# Altium footprint library smd-ipc.PCBLIB: 363 footprints (part 21 of 27) (continued)
## SQFP-S-14X14-168 [mm]
pads (168):
  rect 0.17x1.6 smd: 1(-6.15,-7.6) 2(-5.85,-7.6) 3(-5.55,-7.6) 4(-5.25,-7.6) 5(-4.95,-7.6) 6(-4.65,-7.6) 7(-4.35,-7.6) 8(-4.05,-7.6) 9(-3.75,-7.6) 10(-3.45,-7.6) 11(-3.15,-7.6) 12(-2.85,-7.6) 13(-2.55,-7.6) 14(-2.25,-7.6) 15(-1.95,-7.6) 16(-1.65,-7.6) 17(-1.35,-7.6) 18(-1.05,-7.6) 19(-0.75,-7.6) 20(-0.45,-7.6) 21(-0.15,-7.6) 22(0.15,-7.6) 23(0.45,-7.6) 24(0.75,-7.6) 25(1.05,-7.6) 26(1.35,-7.6) 27(1.65,-7.6) 28(1.95,-7.6) 29(2.25,-7.6) 30(2.55,-7.6) 31(2.85,-7.6) 32(3.15,-7.6) 33(3.45,-7.6) 34(3.75,-7.6) 35(4.05,-7.6) 36(4.35,-7.6) 37(4.65,-7.6) 38(4.95,-7.6) 39(5.25,-7.6) 40(5.55,-7.6) 41(5.85,-7.6) 42(6.15,-7.6) 85(6.15,7.6) 86(5.85,7.6) 87(5.55,7.6) 88(5.25,7.6) 89(4.95,7.6) 90(4.65,7.6) 91(4.35,7.6) 92(4.05,7.6) 93(3.75,7.6) 94(3.45,7.6) 95(3.15,7.6) 96(2.85,7.6) 97(2.55,7.6) 98(2.25,7.6) 99(1.95,7.6) 100(1.65,7.6) 101(1.35,7.6) 102(1.05,7.6) 103(0.75,7.6) 104(0.45,7.6) 105(0.15,7.6) 106(-0.15,7.6) 107(-0.45,7.6) 108(-0.75,7.6) 109(-1.05,7.6) 110(-1.35,7.6) 111(-1.65,7.6) 112(-1.95,7.6) 113(-2.25,7.6) 114(-2.55,7.6) 115(-2.85,7.6) 116(-3.15,7.6) 117(-3.45,7.6) 118(-3.75,7.6) 119(-4.05,7.6) 120(-4.35,7.6) 121(-4.65,7.6) 122(-4.95,7.6) 123(-5.25,7.6) 124(-5.55,7.6) 125(-5.85,7.6) 126(-6.15,7.6)
  rect 1.6x0.17 smd: 43(7.6,-6.15) 44(7.6,-5.85) 45(7.6,-5.55) 46(7.6,-5.25) 47(7.6,-4.95) 48(7.6,-4.65) 49(7.6,-4.35) 50(7.6,-4.05) 51(7.6,-3.75) 52(7.6,-3.45) 53(7.6,-3.15) 54(7.6,-2.85) 55(7.6,-2.55) 56(7.6,-2.25) 57(7.6,-1.95) 58(7.6,-1.65) 59(7.6,-1.35) 60(7.6,-1.05) 61(7.6,-0.75) 62(7.6,-0.45) 63(7.6,-0.15) 64(7.6,0.15) 65(7.6,0.45) 66(7.6,0.75) 67(7.6,1.05) 68(7.6,1.35) 69(7.6,1.65) 70(7.6,1.95) 71(7.6,2.25) 72(7.6,2.55) 73(7.6,2.85) 74(7.6,3.15) 75(7.6,3.45) 76(7.6,3.75) 77(7.6,4.05) 78(7.6,4.35) 79(7.6,4.65) 80(7.6,4.95) 81(7.6,5.25) 82(7.6,5.55) 83(7.6,5.85) 84(7.6,6.15) 127(-7.6,6.15) 128(-7.6,5.85) 129(-7.6,5.55) 130(-7.6,5.25) 131(-7.6,4.95) 132(-7.6,4.65) 133(-7.6,4.35) 134(-7.6,4.05) 135(-7.6,3.75) 136(-7.6,3.45) 137(-7.6,3.15) 138(-7.6,2.85) 139(-7.6,2.55) 140(-7.6,2.25) 141(-7.6,1.95) 142(-7.6,1.65) 143(-7.6,1.35) 144(-7.6,1.05) 145(-7.6,0.75) 146(-7.6,0.45) 147(-7.6,0.15) 148(-7.6,-0.15) 149(-7.6,-0.45) 150(-7.6,-0.75) 151(-7.6,-1.05) 152(-7.6,-1.35) 153(-7.6,-1.65) 154(-7.6,-1.95) 155(-7.6,-2.25) 156(-7.6,-2.55) 157(-7.6,-2.85) 158(-7.6,-3.15) 159(-7.6,-3.45) 160(-7.6,-3.75) 161(-7.6,-4.05) 162(-7.6,-4.35) 163(-7.6,-4.65) 164(-7.6,-4.95) 165(-7.6,-5.25) 166(-7.6,-5.55) 167(-7.6,-5.85) 168(-7.6,-6.15)
Top Overlay:
  circle w0.254: c-5.5,-5.5 r0.75
  lines w0.203: -6.72,-6.71 6.71,-6.71 6.71,6.71 -6.72,6.71 -6.72,-6.71
Mechanical 16:
  drawing of 172 lines, arcs and shapes, not listed
Mechanical 27:
  lines w0.2: -8.9,-8.9 -8.9,8.9 8.9,8.9 8.9,-8.9 -8.9,-8.9

## SQFP-S-14X14-176 [mm]
pads (176):
  rect 0.17x1.6 smd: 1(-6.45,-7.6) 2(-6.15,-7.6) 3(-5.85,-7.6) 4(-5.55,-7.6) 5(-5.25,-7.6) 6(-4.95,-7.6) 7(-4.65,-7.6) 8(-4.35,-7.6) 9(-4.05,-7.6) 10(-3.75,-7.6) 11(-3.45,-7.6) 12(-3.15,-7.6) 13(-2.85,-7.6) 14(-2.55,-7.6) 15(-2.25,-7.6) 16(-1.95,-7.6) 17(-1.65,-7.6) 18(-1.35,-7.6) 19(-1.05,-7.6) 20(-0.75,-7.6) 21(-0.45,-7.6) 22(-0.15,-7.6) 23(0.15,-7.6) 24(0.45,-7.6) 25(0.75,-7.6) 26(1.05,-7.6) 27(1.35,-7.6) 28(1.65,-7.6) 29(1.95,-7.6) 30(2.25,-7.6) 31(2.55,-7.6) 32(2.85,-7.6) 33(3.15,-7.6) 34(3.45,-7.6) 35(3.75,-7.6) 36(4.05,-7.6) 37(4.35,-7.6) 38(4.65,-7.6) 39(4.95,-7.6) 40(5.25,-7.6) 41(5.55,-7.6) 42(5.85,-7.6) 43(6.15,-7.6) 44(6.45,-7.6) 89(6.45,7.6) 90(6.15,7.6) 91(5.85,7.6) 92(5.55,7.6) 93(5.25,7.6) 94(4.95,7.6) 95(4.65,7.6) 96(4.35,7.6) 97(4.05,7.6) 98(3.75,7.6) 99(3.45,7.6) 100(3.15,7.6) 101(2.85,7.6) 102(2.55,7.6) 103(2.25,7.6) 104(1.95,7.6) 105(1.65,7.6) 106(1.35,7.6) 107(1.05,7.6) 108(0.75,7.6) 109(0.45,7.6) 110(0.15,7.6) 111(-0.15,7.6) 112(-0.45,7.6) 113(-0.75,7.6) 114(-1.05,7.6) 115(-1.35,7.6) 116(-1.65,7.6) 117(-1.95,7.6) 118(-2.25,7.6) 119(-2.55,7.6) 120(-2.85,7.6) 121(-3.15,7.6) 122(-3.45,7.6) 123(-3.75,7.6) 124(-4.05,7.6) 125(-4.35,7.6) 126(-4.65,7.6) 127(-4.95,7.6) 128(-5.25,7.6) 129(-5.55,7.6) 130(-5.85,7.6) 131(-6.15,7.6) 132(-6.45,7.6)
  rect 1.6x0.17 smd: 45(7.6,-6.45) 46(7.6,-6.15) 47(7.6,-5.85) 48(7.6,-5.55) 49(7.6,-5.25) 50(7.6,-4.95) 51(7.6,-4.65) 52(7.6,-4.35) 53(7.6,-4.05) 54(7.6,-3.75) 55(7.6,-3.45) 56(7.6,-3.15) 57(7.6,-2.85) 58(7.6,-2.55) 59(7.6,-2.25) 60(7.6,-1.95) 61(7.6,-1.65) 62(7.6,-1.35) 63(7.6,-1.05) 64(7.6,-0.75) 65(7.6,-0.45) 66(7.6,-0.15) 67(7.6,0.15) 68(7.6,0.45) 69(7.6,0.75) 70(7.6,1.05) 71(7.6,1.35) 72(7.6,1.65) 73(7.6,1.95) 74(7.6,2.25) 75(7.6,2.55) 76(7.6,2.85) 77(7.6,3.15) 78(7.6,3.45) 79(7.6,3.75) 80(7.6,4.05) 81(7.6,4.35) 82(7.6,4.65) 83(7.6,4.95) 84(7.6,5.25) 85(7.6,5.55) 86(7.6,5.85) 87(7.6,6.15) 88(7.6,6.45) 133(-7.6,6.45) 134(-7.6,6.15) 135(-7.6,5.85) 136(-7.6,5.55) 137(-7.6,5.25) 138(-7.6,4.95) 139(-7.6,4.65) 140(-7.6,4.35) 141(-7.6,4.05) 142(-7.6,3.75) 143(-7.6,3.45) 144(-7.6,3.15) 145(-7.6,2.85) 146(-7.6,2.55) 147(-7.6,2.25) 148(-7.6,1.95) 149(-7.6,1.65) 150(-7.6,1.35) 151(-7.6,1.05) 152(-7.6,0.75) 153(-7.6,0.45) 154(-7.6,0.15) 155(-7.6,-0.15) 156(-7.6,-0.45) 157(-7.6,-0.75) 158(-7.6,-1.05) 159(-7.6,-1.35) 160(-7.6,-1.65) 161(-7.6,-1.95) 162(-7.6,-2.25) 163(-7.6,-2.55) 164(-7.6,-2.85) 165(-7.6,-3.15) 166(-7.6,-3.45) 167(-7.6,-3.75) 168(-7.6,-4.05) 169(-7.6,-4.35) 170(-7.6,-4.65) 171(-7.6,-4.95) 172(-7.6,-5.25) 173(-7.6,-5.55) 174(-7.6,-5.85) 175(-7.6,-6.15) 176(-7.6,-6.45)
Top Overlay:
  circle w0.254: c-5.5,-5.5 r0.75
  lines w0.203: -6.72,-6.71 6.71,-6.71 6.71,6.71 -6.72,6.71 -6.72,-6.71
Mechanical 16:
  drawing of 180 lines, arcs and shapes, not listed
Mechanical 27:
  lines w0.2: -8.9,-8.9 -8.9,8.9 8.9,8.9 8.9,-8.9 -8.9,-8.9

## SQFP-S-20X20-144 [mm]
pads (144):
  rect 0.3x1.6 smd: 1(-8.75,-10.6) 2(-8.25,-10.6) 3(-7.75,-10.6) 4(-7.25,-10.6) 5(-6.75,-10.6) 6(-6.25,-10.6) 7(-5.75,-10.6) 8(-5.25,-10.6) 9(-4.75,-10.6) 10(-4.25,-10.6) 11(-3.75,-10.6) 12(-3.25,-10.6) 13(-2.75,-10.6) 14(-2.25,-10.6) 15(-1.75,-10.6) 16(-1.25,-10.6) 17(-0.75,-10.6) 18(-0.25,-10.6) 19(0.25,-10.6) 20(0.75,-10.6) 21(1.25,-10.6) 22(1.75,-10.6) 23(2.25,-10.6) 24(2.75,-10.6) 25(3.25,-10.6) 26(3.75,-10.6) 27(4.25,-10.6) 28(4.75,-10.6) 29(5.25,-10.6) 30(5.75,-10.6) 31(6.25,-10.6) 32(6.75,-10.6) 33(7.25,-10.6) 34(7.75,-10.6) 35(8.25,-10.6) 36(8.75,-10.6) 73(8.75,10.6) 74(8.25,10.6) 75(7.75,10.6) 76(7.25,10.6) 77(6.75,10.6) 78(6.25,10.6) 79(5.75,10.6) 80(5.25,10.6) 81(4.75,10.6) 82(4.25,10.6) 83(3.75,10.6) 84(3.25,10.6) 85(2.75,10.6) 86(2.25,10.6) 87(1.75,10.6) 88(1.25,10.6) 89(0.75,10.6) 90(0.25,10.6) 91(-0.25,10.6) 92(-0.75,10.6) 93(-1.25,10.6) 94(-1.75,10.6) 95(-2.25,10.6) 96(-2.75,10.6) 97(-3.25,10.6) 98(-3.75,10.6) 99(-4.25,10.6) 100(-4.75,10.6) 101(-5.25,10.6) 102(-5.75,10.6) 103(-6.25,10.6) 104(-6.75,10.6) 105(-7.25,10.6) 106(-7.75,10.6) 107(-8.25,10.6) 108(-8.75,10.6)
  rect 1.6x0.3 smd: 37(10.6,-8.75) 38(10.6,-8.25) 39(10.6,-7.75) 40(10.6,-7.25) 41(10.6,-6.75) 42(10.6,-6.25) 43(10.6,-5.75) 44(10.6,-5.25) 45(10.6,-4.75) 46(10.6,-4.25) 47(10.6,-3.75) 48(10.6,-3.25) 49(10.6,-2.75) 50(10.6,-2.25) 51(10.6,-1.75) 52(10.6,-1.25) 53(10.6,-0.75) 54(10.6,-0.25) 55(10.6,0.25) 56(10.6,0.75) 57(10.6,1.25) 58(10.6,1.75) 59(10.6,2.25) 60(10.6,2.75) 61(10.6,3.25) 62(10.6,3.75) 63(10.6,4.25) 64(10.6,4.75) 65(10.6,5.25) 66(10.6,5.75) 67(10.6,6.25) 68(10.6,6.75) 69(10.6,7.25) 70(10.6,7.75) 71(10.6,8.25) 72(10.6,8.75) 109(-10.6,8.75) 110(-10.6,8.25) 111(-10.6,7.75) 112(-10.6,7.25) 113(-10.6,6.75) 114(-10.6,6.25) 115(-10.6,5.75) 116(-10.6,5.25) 117(-10.6,4.75) 118(-10.6,4.25) 119(-10.6,3.75) 120(-10.6,3.25) 121(-10.6,2.75) 122(-10.6,2.25) 123(-10.6,1.75) 124(-10.6,1.25) 125(-10.6,0.75) 126(-10.6,0.25) 127(-10.6,-0.25) 128(-10.6,-0.75) 129(-10.6,-1.25) 130(-10.6,-1.75) 131(-10.6,-2.25) 132(-10.6,-2.75) 133(-10.6,-3.25) 134(-10.6,-3.75) 135(-10.6,-4.25) 136(-10.6,-4.75) 137(-10.6,-5.25) 138(-10.6,-5.75) 139(-10.6,-6.25) 140(-10.6,-6.75) 141(-10.6,-7.25) 142(-10.6,-7.75) 143(-10.6,-8.25) 144(-10.6,-8.75)
Top Overlay:
  circle w0.254: c-8.5,-8.5 r0.75
  lines w0.203: -9.72,-9.71 9.71,-9.71 9.71,9.71 -9.72,9.71 -9.72,-9.71
Mechanical 16:
  rectangle: -8.9,-10.9 -8.6,-9.95
  rectangle: -8.4,-10.9 -8.1,-9.95
  rectangle: -7.9,-10.9 -7.6,-9.95
  rectangle: -7.4,-10.9 -7.1,-9.95
  rectangle: -6.9,-10.9 -6.6,-9.95
  rectangle: -6.4,-10.9 -6.1,-9.95
  rectangle: -5.9,-10.9 -5.6,-9.95
  rectangle: -5.4,-10.9 -5.1,-9.95
  rectangle: -4.9,-10.9 -4.6,-9.95
  rectangle: -4.4,-10.9 -4.1,-9.95
  rectangle: -3.9,-10.9 -3.6,-9.95
  rectangle: -3.4,-10.9 -3.1,-9.95
  rectangle: -2.9,-10.9 -2.6,-9.95
  rectangle: -2.4,-10.9 -2.1,-9.95
  rectangle: -1.9,-10.9 -1.6,-9.95
  rectangle: -1.4,-10.9 -1.1,-9.95
  rectangle: -0.9,-10.9 -0.6,-9.95
  rectangle: -0.4,-10.9 -0.1,-9.95
  rectangle: 0.1,-10.9 0.4,-9.95
  rectangle: 0.6,-10.9 0.9,-9.95
  rectangle: 1.1,-10.9 1.4,-9.95
  rectangle: 1.6,-10.9 1.9,-9.95
  rectangle: 2.1,-10.9 2.4,-9.95
  rectangle: 2.6,-10.9 2.9,-9.95
  rectangle: 3.1,-10.9 3.4,-9.95
  rectangle: 3.6,-10.9 3.9,-9.95
  rectangle: 4.1,-10.9 4.4,-9.95
  rectangle: 4.6,-10.9 4.9,-9.95
  rectangle: 5.1,-10.9 5.4,-9.95
  rectangle: 5.6,-10.9 5.9,-9.95
  rectangle: 6.1,-10.9 6.4,-9.95
  rectangle: 6.6,-10.9 6.9,-9.95
  rectangle: 7.1,-10.9 7.4,-9.95
  rectangle: 7.6,-10.9 7.9,-9.95
  rectangle: 8.1,-10.9 8.4,-9.95
  rectangle: 8.6,-10.9 8.9,-9.95
  rectangle: 9.95,-8.9 10.9,-8.6
  rectangle: 9.95,-8.4 10.9,-8.1
  rectangle: 9.95,-7.9 10.9,-7.6
  rectangle: 9.95,-7.4 10.9,-7.1
  rectangle: 9.95,-6.9 10.9,-6.6
  rectangle: 9.95,-6.4 10.9,-6.1
  rectangle: 9.95,-5.9 10.9,-5.6
  rectangle: 9.95,-5.4 10.9,-5.1
  rectangle: 9.95,-4.9 10.9,-4.6
  rectangle: 9.95,-4.4 10.9,-4.1
  rectangle: 9.95,-3.9 10.9,-3.6
  rectangle: 9.95,-3.4 10.9,-3.1
  rectangle: 9.95,-2.9 10.9,-2.6
  rectangle: 9.95,-2.4 10.9,-2.1
  rectangle: 9.95,-1.9 10.9,-1.6
  rectangle: 9.95,-1.4 10.9,-1.1
  rectangle: 9.95,-0.9 10.9,-0.6
  rectangle: 9.95,-0.4 10.9,-0.1
  rectangle: 9.95,0.1 10.9,0.4
  rectangle: 9.95,0.6 10.9,0.9
  rectangle: 9.95,1.1 10.9,1.4
  rectangle: 9.95,1.6 10.9,1.9
  rectangle: 9.95,2.1 10.9,2.4
  rectangle: 9.95,2.6 10.9,2.9
  rectangle: 9.95,3.1 10.9,3.4
  rectangle: 9.95,3.6 10.9,3.9
  rectangle: 9.95,4.1 10.9,4.4
  rectangle: 9.95,4.6 10.9,4.9
  rectangle: 9.95,5.1 10.9,5.4
  rectangle: 9.95,5.6 10.9,5.9
  rectangle: 9.95,6.1 10.9,6.4
  rectangle: 9.95,6.6 10.9,6.9
  rectangle: 9.95,7.1 10.9,7.4
  rectangle: 9.95,7.6 10.9,7.9
  rectangle: 9.95,8.1 10.9,8.4
  rectangle: 9.95,8.6 10.9,8.9
  rectangle: 8.6,9.95 8.9,10.9
  rectangle: 8.1,9.95 8.4,10.9
  rectangle: 7.6,9.95 7.9,10.9
  rectangle: 7.1,9.95 7.4,10.9
  rectangle: 6.6,9.95 6.9,10.9
  rectangle: 6.1,9.95 6.4,10.9
  rectangle: 5.6,9.95 5.9,10.9
  rectangle: 5.1,9.95 5.4,10.9
  rectangle: 4.6,9.95 4.9,10.9
  rectangle: 4.1,9.95 4.4,10.9
  rectangle: 3.6,9.95 3.9,10.9
  rectangle: 3.1,9.95 3.4,10.9
  rectangle: 2.6,9.95 2.9,10.9
  rectangle: 2.1,9.95 2.4,10.9
  rectangle: 1.6,9.95 1.9,10.9
  rectangle: 1.1,9.95 1.4,10.9
  rectangle: 0.6,9.95 0.9,10.9
  rectangle: 0.1,9.95 0.4,10.9
  rectangle: -0.4,9.95 -0.1,10.9
  rectangle: -0.9,9.95 -0.6,10.9
  rectangle: -1.4,9.95 -1.1,10.9
  rectangle: -1.9,9.95 -1.6,10.9
  rectangle: -2.4,9.95 -2.1,10.9
  rectangle: -2.9,9.95 -2.6,10.9
  rectangle: -3.4,9.95 -3.1,10.9
  rectangle: -3.9,9.95 -3.6,10.9
  rectangle: -4.4,9.95 -4.1,10.9
  rectangle: -4.9,9.95 -4.6,10.9
  rectangle: -5.4,9.95 -5.1,10.9
  rectangle: -5.9,9.95 -5.6,10.9
  rectangle: -6.4,9.95 -6.1,10.9
  rectangle: -6.9,9.95 -6.6,10.9
  rectangle: -7.4,9.95 -7.1,10.9
  rectangle: -7.9,9.95 -7.6,10.9
  rectangle: -8.4,9.95 -8.1,10.9
  rectangle: -8.9,9.95 -8.6,10.9
  rectangle: -10.9,8.6 -9.95,8.9
  rectangle: -10.9,8.1 -9.95,8.4
  rectangle: -10.9,7.6 -9.95,7.9
  rectangle: -10.9,7.1 -9.95,7.4
  rectangle: -10.9,6.6 -9.95,6.9
  rectangle: -10.9,6.1 -9.95,6.4
  rectangle: -10.9,5.6 -9.95,5.9
  rectangle: -10.9,5.1 -9.95,5.4
  rectangle: -10.9,4.6 -9.95,4.9
  rectangle: -10.9,4.1 -9.95,4.4
  rectangle: -10.9,3.6 -9.95,3.9
  rectangle: -10.9,3.1 -9.95,3.4
  rectangle: -10.9,2.6 -9.95,2.9
  rectangle: -10.9,2.1 -9.95,2.4
  rectangle: -10.9,1.6 -9.95,1.9
  rectangle: -10.9,1.1 -9.95,1.4
  rectangle: -10.9,0.6 -9.95,0.9
  rectangle: -10.9,0.1 -9.95,0.4
  rectangle: -10.9,-0.4 -9.95,-0.1
  rectangle: -10.9,-0.9 -9.95,-0.6
  rectangle: -10.9,-1.4 -9.95,-1.1
  rectangle: -10.9,-1.9 -9.95,-1.6
  rectangle: -10.9,-2.4 -9.95,-2.1
  rectangle: -10.9,-2.9 -9.95,-2.6
  rectangle: -10.9,-3.4 -9.95,-3.1
  rectangle: -10.9,-3.9 -9.95,-3.6
  rectangle: -10.9,-4.4 -9.95,-4.1
  rectangle: -10.9,-4.9 -9.95,-4.6
  rectangle: -10.9,-5.4 -9.95,-5.1
  rectangle: -10.9,-5.9 -9.95,-5.6
  rectangle: -10.9,-6.4 -9.95,-6.1
  rectangle: -10.9,-6.9 -9.95,-6.6
  rectangle: -10.9,-7.4 -9.95,-7.1
  rectangle: -10.9,-7.9 -9.95,-7.6
  rectangle: -10.9,-8.4 -9.95,-8.1
  rectangle: -10.9,-8.9 -9.95,-8.6
  lines w0.203: -9.91,-9.91 9.91,-9.91 9.91,9.91 -9.91,9.91 -9.91,-9.91
Mechanical 27:
  lines w0.2: -11.9,-11.9 -11.9,11.9 11.9,11.9 11.9,-11.9 -11.9,-11.9

## SQFP-S-20X20-152 [mm]
pads (152):
  rect 0.3x1.6 smd: 1(-9.25,-10.6) 2(-8.75,-10.6) 3(-8.25,-10.6) 4(-7.75,-10.6) 5(-7.25,-10.6) 6(-6.75,-10.6) 7(-6.25,-10.6) 8(-5.75,-10.6) 9(-5.25,-10.6) 10(-4.75,-10.6) 11(-4.25,-10.6) 12(-3.75,-10.6) 13(-3.25,-10.6) 14(-2.75,-10.6) 15(-2.25,-10.6) 16(-1.75,-10.6) 17(-1.25,-10.6) 18(-0.75,-10.6) 19(-0.25,-10.6) 20(0.25,-10.6) 21(0.75,-10.6) 22(1.25,-10.6) 23(1.75,-10.6) 24(2.25,-10.6) 25(2.75,-10.6) 26(3.25,-10.6) 27(3.75,-10.6) 28(4.25,-10.6) 29(4.75,-10.6) 30(5.25,-10.6) 31(5.75,-10.6) 32(6.25,-10.6) 33(6.75,-10.6) 34(7.25,-10.6) 35(7.75,-10.6) 36(8.25,-10.6) 37(8.75,-10.6) 38(9.25,-10.6) 77(9.25,10.6) 78(8.75,10.6) 79(8.25,10.6) 80(7.75,10.6) 81(7.25,10.6) 82(6.75,10.6) 83(6.25,10.6) 84(5.75,10.6) 85(5.25,10.6) 86(4.75,10.6) 87(4.25,10.6) 88(3.75,10.6) 89(3.25,10.6) 90(2.75,10.6) 91(2.25,10.6) 92(1.75,10.6) 93(1.25,10.6) 94(0.75,10.6) 95(0.25,10.6) 96(-0.25,10.6) 97(-0.75,10.6) 98(-1.25,10.6) 99(-1.75,10.6) 100(-2.25,10.6) 101(-2.75,10.6) 102(-3.25,10.6) 103(-3.75,10.6) 104(-4.25,10.6) 105(-4.75,10.6) 106(-5.25,10.6) 107(-5.75,10.6) 108(-6.25,10.6) 109(-6.75,10.6) 110(-7.25,10.6) 111(-7.75,10.6) 112(-8.25,10.6) 113(-8.75,10.6) 114(-9.25,10.6)
  rect 1.6x0.3 smd: 39(10.6,-9.25) 40(10.6,-8.75) 41(10.6,-8.25) 42(10.6,-7.75) 43(10.6,-7.25) 44(10.6,-6.75) 45(10.6,-6.25) 46(10.6,-5.75) 47(10.6,-5.25) 48(10.6,-4.75) 49(10.6,-4.25) 50(10.6,-3.75) 51(10.6,-3.25) 52(10.6,-2.75) 53(10.6,-2.25) 54(10.6,-1.75) 55(10.6,-1.25) 56(10.6,-0.75) 57(10.6,-0.25) 58(10.6,0.25) 59(10.6,0.75) 60(10.6,1.25) 61(10.6,1.75) 62(10.6,2.25) 63(10.6,2.75) 64(10.6,3.25) 65(10.6,3.75) 66(10.6,4.25) 67(10.6,4.75) 68(10.6,5.25) 69(10.6,5.75) 70(10.6,6.25) 71(10.6,6.75) 72(10.6,7.25) 73(10.6,7.75) 74(10.6,8.25) 75(10.6,8.75) 76(10.6,9.25) 115(-10.6,9.25) 116(-10.6,8.75) 117(-10.6,8.25) 118(-10.6,7.75) 119(-10.6,7.25) 120(-10.6,6.75) 121(-10.6,6.25) 122(-10.6,5.75) 123(-10.6,5.25) 124(-10.6,4.75) 125(-10.6,4.25) 126(-10.6,3.75) 127(-10.6,3.25) 128(-10.6,2.75) 129(-10.6,2.25) 130(-10.6,1.75) 131(-10.6,1.25) 132(-10.6,0.75) 133(-10.6,0.25) 134(-10.6,-0.25) 135(-10.6,-0.75) 136(-10.6,-1.25) 137(-10.6,-1.75) 138(-10.6,-2.25) 139(-10.6,-2.75) 140(-10.6,-3.25) 141(-10.6,-3.75) 142(-10.6,-4.25) 143(-10.6,-4.75) 144(-10.6,-5.25) 145(-10.6,-5.75) 146(-10.6,-6.25) 147(-10.6,-6.75) 148(-10.6,-7.25) 149(-10.6,-7.75) 150(-10.6,-8.25) 151(-10.6,-8.75) 152(-10.6,-9.25)
Top Overlay:
  circle w0.254: c-8.5,-8.5 r0.75
  lines w0.203: -9.72,-9.71 9.71,-9.71 9.71,9.71 -9.72,9.71 -9.72,-9.71
Mechanical 16:
  drawing of 156 lines, arcs and shapes, not listed
Mechanical 27:
  lines w0.2: -11.9,-11.9 -11.9,11.9 11.9,11.9 11.9,-11.9 -11.9,-11.9

## SQFP-S-20X20-184 [mm]
pads (184):
  rect 0.25x1.6 smd: 1(-9,-10.6) 2(-8.6,-10.6) 3(-8.2,-10.6) 4(-7.8,-10.6) 5(-7.4,-10.6) 6(-7,-10.6) 7(-6.6,-10.6) 8(-6.2,-10.6) 9(-5.8,-10.6) 10(-5.4,-10.6) 11(-5,-10.6) 12(-4.6,-10.6) 13(-4.2,-10.6) 14(-3.8,-10.6) 15(-3.4,-10.6) 16(-3,-10.6) 17(-2.6,-10.6) 18(-2.2,-10.6) 19(-1.8,-10.6) 20(-1.4,-10.6) 21(-1,-10.6) 22(-0.6,-10.6) 23(-0.2,-10.6) 24(0.2,-10.6) 25(0.6,-10.6) 26(1,-10.6) 27(1.4,-10.6) 28(1.8,-10.6) 29(2.2,-10.6) 30(2.6,-10.6) 31(3,-10.6) 32(3.4,-10.6) 33(3.8,-10.6) 34(4.2,-10.6) 35(4.6,-10.6) 36(5,-10.6) 37(5.4,-10.6) 38(5.8,-10.6) 39(6.2,-10.6) 40(6.6,-10.6) 41(7,-10.6) 42(7.4,-10.6) 43(7.8,-10.6) 44(8.2,-10.6) 45(8.6,-10.6) 46(9,-10.6) 93(9,10.6) 94(8.6,10.6) 95(8.2,10.6) 96(7.8,10.6) 97(7.4,10.6) 98(7,10.6) 99(6.6,10.6) 100(6.2,10.6) 101(5.8,10.6) 102(5.4,10.6) 103(5,10.6) 104(4.6,10.6) 105(4.2,10.6) 106(3.8,10.6) 107(3.4,10.6) 108(3,10.6) 109(2.6,10.6) 110(2.2,10.6) 111(1.8,10.6) 112(1.4,10.6) 113(1,10.6) 114(0.6,10.6) 115(0.2,10.6) 116(-0.2,10.6) 117(-0.6,10.6) 118(-1,10.6) 119(-1.4,10.6) 120(-1.8,10.6) 121(-2.2,10.6) 122(-2.6,10.6) 123(-3,10.6) 124(-3.4,10.6) 125(-3.8,10.6) 126(-4.2,10.6) 127(-4.6,10.6) 128(-5,10.6) 129(-5.4,10.6) 130(-5.8,10.6) 131(-6.2,10.6) 132(-6.6,10.6) 133(-7,10.6) 134(-7.4,10.6) 135(-7.8,10.6) 136(-8.2,10.6) 137(-8.6,10.6) 138(-9,10.6)
  rect 1.6x0.25 smd: 47(10.6,-9) 48(10.6,-8.6) 49(10.6,-8.2) 50(10.6,-7.8) 51(10.6,-7.4) 52(10.6,-7) 53(10.6,-6.6) 54(10.6,-6.2) 55(10.6,-5.8) 56(10.6,-5.4) 57(10.6,-5) 58(10.6,-4.6) 59(10.6,-4.2) 60(10.6,-3.8) 61(10.6,-3.4) 62(10.6,-3) 63(10.6,-2.6) 64(10.6,-2.2) 65(10.6,-1.8) 66(10.6,-1.4) 67(10.6,-1) 68(10.6,-0.6) 69(10.6,-0.2) 70(10.6,0.2) 71(10.6,0.6) 72(10.6,1) 73(10.6,1.4) 74(10.6,1.8) 75(10.6,2.2) 76(10.6,2.6) 77(10.6,3) 78(10.6,3.4) 79(10.6,3.8) 80(10.6,4.2) 81(10.6,4.6) 82(10.6,5) 83(10.6,5.4) 84(10.6,5.8) 85(10.6,6.2) 86(10.6,6.6) 87(10.6,7) 88(10.6,7.4) 89(10.6,7.8) 90(10.6,8.2) 91(10.6,8.6) 92(10.6,9) 139(-10.6,9) 140(-10.6,8.6) 141(-10.6,8.2) 142(-10.6,7.8) 143(-10.6,7.4) 144(-10.6,7) 145(-10.6,6.6) 146(-10.6,6.2) 147(-10.6,5.8) 148(-10.6,5.4) 149(-10.6,5) 150(-10.6,4.6) 151(-10.6,4.2) 152(-10.6,3.8) 153(-10.6,3.4) 154(-10.6,3) 155(-10.6,2.6) 156(-10.6,2.2) 157(-10.6,1.8) 158(-10.6,1.4) 159(-10.6,1) 160(-10.6,0.6) 161(-10.6,0.2) 162(-10.6,-0.2) 163(-10.6,-0.6) 164(-10.6,-1) 165(-10.6,-1.4) 166(-10.6,-1.8) 167(-10.6,-2.2) 168(-10.6,-2.6) 169(-10.6,-3) 170(-10.6,-3.4) 171(-10.6,-3.8) 172(-10.6,-4.2) 173(-10.6,-4.6) 174(-10.6,-5) 175(-10.6,-5.4) 176(-10.6,-5.8) 177(-10.6,-6.2) 178(-10.6,-6.6) 179(-10.6,-7) 180(-10.6,-7.4) 181(-10.6,-7.8) 182(-10.6,-8.2) 183(-10.6,-8.6) 184(-10.6,-9)
Top Overlay:
  circle w0.254: c-8.5,-8.5 r0.75
  lines w0.203: -9.72,-9.71 9.71,-9.71 9.71,9.71 -9.72,9.71 -9.72,-9.71
Mechanical 16:
  drawing of 188 lines, arcs and shapes, not listed
Mechanical 27:
  lines w0.2: -11.9,-11.9 -11.9,11.9 11.9,11.9 11.9,-11.9 -11.9,-11.9

## SQFP-S-20X20-192 [mm]
pads (192):
  rect 0.25x1.6 smd: 1(-9.4,-10.6) 2(-9,-10.6) 3(-8.6,-10.6) 4(-8.2,-10.6) 5(-7.8,-10.6) 6(-7.4,-10.6) 7(-7,-10.6) 8(-6.6,-10.6) 9(-6.2,-10.6) 10(-5.8,-10.6) 11(-5.4,-10.6) 12(-5,-10.6) 13(-4.6,-10.6) 14(-4.2,-10.6) 15(-3.8,-10.6) 16(-3.4,-10.6) 17(-3,-10.6) 18(-2.6,-10.6) 19(-2.2,-10.6) 20(-1.8,-10.6) 21(-1.4,-10.6) 22(-1,-10.6) 23(-0.6,-10.6) 24(-0.2,-10.6) 25(0.2,-10.6) 26(0.6,-10.6) 27(1,-10.6) 28(1.4,-10.6) 29(1.8,-10.6) 30(2.2,-10.6) 31(2.6,-10.6) 32(3,-10.6) 33(3.4,-10.6) 34(3.8,-10.6) 35(4.2,-10.6) 36(4.6,-10.6) 37(5,-10.6) 38(5.4,-10.6) 39(5.8,-10.6) 40(6.2,-10.6) 41(6.6,-10.6) 42(7,-10.6) 43(7.4,-10.6) 44(7.8,-10.6) 45(8.2,-10.6) 46(8.6,-10.6) 47(9,-10.6) 48(9.4,-10.6) 97(9.4,10.6) 98(9,10.6) 99(8.6,10.6) 100(8.2,10.6) 101(7.8,10.6) 102(7.4,10.6) 103(7,10.6) 104(6.6,10.6) 105(6.2,10.6) 106(5.8,10.6) 107(5.4,10.6) 108(5,10.6) 109(4.6,10.6) 110(4.2,10.6) 111(3.8,10.6) 112(3.4,10.6) 113(3,10.6) 114(2.6,10.6) 115(2.2,10.6) 116(1.8,10.6) 117(1.4,10.6) 118(1,10.6) 119(0.6,10.6) 120(0.2,10.6) 121(-0.2,10.6) 122(-0.6,10.6) 123(-1,10.6) 124(-1.4,10.6) 125(-1.8,10.6) 126(-2.2,10.6) 127(-2.6,10.6) 128(-3,10.6) 129(-3.4,10.6) 130(-3.8,10.6) 131(-4.2,10.6) 132(-4.6,10.6) 133(-5,10.6) 134(-5.4,10.6) 135(-5.8,10.6) 136(-6.2,10.6) 137(-6.6,10.6) 138(-7,10.6) 139(-7.4,10.6) 140(-7.8,10.6) 141(-8.2,10.6) 142(-8.6,10.6) 143(-9,10.6) 144(-9.4,10.6)
  rect 1.6x0.25 smd: 49(10.6,-9.4) 50(10.6,-9) 51(10.6,-8.6) 52(10.6,-8.2) 53(10.6,-7.8) 54(10.6,-7.4) 55(10.6,-7) 56(10.6,-6.6) 57(10.6,-6.2) 58(10.6,-5.8) 59(10.6,-5.4) 60(10.6,-5) 61(10.6,-4.6) 62(10.6,-4.2) 63(10.6,-3.8) 64(10.6,-3.4) 65(10.6,-3) 66(10.6,-2.6) 67(10.6,-2.2) 68(10.6,-1.8) 69(10.6,-1.4) 70(10.6,-1) 71(10.6,-0.6) 72(10.6,-0.2) 73(10.6,0.2) 74(10.6,0.6) 75(10.6,1) 76(10.6,1.4) 77(10.6,1.8) 78(10.6,2.2) 79(10.6,2.6) 80(10.6,3) 81(10.6,3.4) 82(10.6,3.8) 83(10.6,4.2) 84(10.6,4.6) 85(10.6,5) 86(10.6,5.4) 87(10.6,5.8) 88(10.6,6.2) 89(10.6,6.6) 90(10.6,7) 91(10.6,7.4) 92(10.6,7.8) 93(10.6,8.2) 94(10.6,8.6) 95(10.6,9) 96(10.6,9.4) 145(-10.6,9.4) 146(-10.6,9) 147(-10.6,8.6) 148(-10.6,8.2) 149(-10.6,7.8) 150(-10.6,7.4) 151(-10.6,7) 152(-10.6,6.6) 153(-10.6,6.2) 154(-10.6,5.8) 155(-10.6,5.4) 156(-10.6,5) 157(-10.6,4.6) 158(-10.6,4.2) 159(-10.6,3.8) 160(-10.6,3.4) 161(-10.6,3) 162(-10.6,2.6) 163(-10.6,2.2) 164(-10.6,1.8) 165(-10.6,1.4) 166(-10.6,1) 167(-10.6,0.6) 168(-10.6,0.2) 169(-10.6,-0.2) 170(-10.6,-0.6) 171(-10.6,-1) 172(-10.6,-1.4) 173(-10.6,-1.8) 174(-10.6,-2.2) 175(-10.6,-2.6) 176(-10.6,-3) 177(-10.6,-3.4) 178(-10.6,-3.8) 179(-10.6,-4.2) 180(-10.6,-4.6) 181(-10.6,-5) 182(-10.6,-5.4) 183(-10.6,-5.8) 184(-10.6,-6.2) 185(-10.6,-6.6) 186(-10.6,-7) 187(-10.6,-7.4) 188(-10.6,-7.8) 189(-10.6,-8.2) 190(-10.6,-8.6) 191(-10.6,-9) 192(-10.6,-9.4)
Top Overlay:
  circle w0.254: c-8.5,-8.5 r0.75
  lines w0.203: -9.72,-9.71 9.71,-9.71 9.71,9.71 -9.72,9.71 -9.72,-9.71
Mechanical 16:
  drawing of 196 lines, arcs and shapes, not listed
Mechanical 27:
  lines w0.2: -11.9,-11.9 -11.9,11.9 11.9,11.9 11.9,-11.9 -11.9,-11.9

## SQFP-S-20X20-248 [mm]
pads (248):
  rect 0.17x1.6 smd: 1(-9.15,-10.45) 2(-8.85,-10.45) 3(-8.55,-10.45) 4(-8.25,-10.45) 5(-7.95,-10.45) 6(-7.65,-10.45) 7(-7.35,-10.45) 8(-7.05,-10.45) 9(-6.75,-10.45) 10(-6.45,-10.45) 11(-6.15,-10.45) 12(-5.85,-10.45) 13(-5.55,-10.45) 14(-5.25,-10.45) 15(-4.95,-10.45) 16(-4.65,-10.45) 17(-4.35,-10.45) 18(-4.05,-10.45) 19(-3.75,-10.45) 20(-3.45,-10.45) 21(-3.15,-10.45) 22(-2.85,-10.45) 23(-2.55,-10.45) 24(-2.25,-10.45) 25(-1.95,-10.45) 26(-1.65,-10.45) 27(-1.35,-10.45) 28(-1.05,-10.45) 29(-0.75,-10.45) 30(-0.45,-10.45) 31(-0.15,-10.45) 32(0.15,-10.45) 33(0.45,-10.45) 34(0.75,-10.45) 35(1.05,-10.45) 36(1.35,-10.45) 37(1.65,-10.45) 38(1.95,-10.45) 39(2.25,-10.45) 40(2.55,-10.45) 41(2.85,-10.45) 42(3.15,-10.45) 43(3.45,-10.45) 44(3.75,-10.45) 45(4.05,-10.45) 46(4.35,-10.45) 47(4.65,-10.45) 48(4.95,-10.45) 49(5.25,-10.45) 50(5.55,-10.45) 51(5.85,-10.45) 52(6.15,-10.45) 53(6.45,-10.45) 54(6.75,-10.45) 55(7.05,-10.45) 56(7.35,-10.45) 57(7.65,-10.45) 58(7.95,-10.45) 59(8.25,-10.45) 60(8.55,-10.45) 61(8.85,-10.45) 62(9.15,-10.45) 125(9.15,10.45) 126(8.85,10.45) 127(8.55,10.45) 128(8.25,10.45) 129(7.95,10.45) 130(7.65,10.45) 131(7.35,10.45) 132(7.05,10.45) 133(6.75,10.45) 134(6.45,10.45) 135(6.15,10.45) 136(5.85,10.45) 137(5.55,10.45) 138(5.25,10.45) 139(4.95,10.45) 140(4.65,10.45) 141(4.35,10.45) 142(4.05,10.45) 143(3.75,10.45) 144(3.45,10.45) 145(3.15,10.45) 146(2.85,10.45) 147(2.55,10.45) 148(2.25,10.45) 149(1.95,10.45) 150(1.65,10.45) 151(1.35,10.45) 152(1.05,10.45) 153(0.75,10.45) 154(0.45,10.45) 155(0.15,10.45) 156(-0.15,10.45) 157(-0.45,10.45) 158(-0.75,10.45) 159(-1.05,10.45) 160(-1.35,10.45) 161(-1.65,10.45) 162(-1.95,10.45) 163(-2.25,10.45) 164(-2.55,10.45) 165(-2.85,10.45) 166(-3.15,10.45) 167(-3.45,10.45) 168(-3.75,10.45) 169(-4.05,10.45) 170(-4.35,10.45) 171(-4.65,10.45) 172(-4.95,10.45) 173(-5.25,10.45) 174(-5.55,10.45) 175(-5.85,10.45) 176(-6.15,10.45) 177(-6.45,10.45) 178(-6.75,10.45) 179(-7.05,10.45) 180(-7.35,10.45) 181(-7.65,10.45) 182(-7.95,10.45) 183(-8.25,10.45) 184(-8.55,10.45) 185(-8.85,10.45) 186(-9.15,10.45)
  rect 1.6x0.17 smd: 63(10.45,-9.15) 64(10.45,-8.85) 65(10.45,-8.55) 66(10.45,-8.25) 67(10.45,-7.95) 68(10.45,-7.65) 69(10.45,-7.35) 70(10.45,-7.05) 71(10.45,-6.75) 72(10.45,-6.45) 73(10.45,-6.15) 74(10.45,-5.85) 75(10.45,-5.55) 76(10.45,-5.25) 77(10.45,-4.95) 78(10.45,-4.65) 79(10.45,-4.35) 80(10.45,-4.05) 81(10.45,-3.75) 82(10.45,-3.45) 83(10.45,-3.15) 84(10.45,-2.85) 85(10.45,-2.55) 86(10.45,-2.25) 87(10.45,-1.95) 88(10.45,-1.65) 89(10.45,-1.35) 90(10.45,-1.05) 91(10.45,-0.75) 92(10.45,-0.45) 93(10.45,-0.15) 94(10.45,0.15) 95(10.45,0.45) 96(10.45,0.75) 97(10.45,1.05) 98(10.45,1.35) 99(10.45,1.65) 100(10.45,1.95) 101(10.45,2.25) 102(10.45,2.55) 103(10.45,2.85) 104(10.45,3.15) 105(10.45,3.45) 106(10.45,3.75) 107(10.45,4.05) 108(10.45,4.35) 109(10.45,4.65) 110(10.45,4.95) 111(10.45,5.25) 112(10.45,5.55) 113(10.45,5.85) 114(10.45,6.15) 115(10.45,6.45) 116(10.45,6.75) 117(10.45,7.05) 118(10.45,7.35) 119(10.45,7.65) 120(10.45,7.95) 121(10.45,8.25) 122(10.45,8.55) 123(10.45,8.85) 124(10.45,9.15) 187(-10.45,9.15) 188(-10.45,8.85) 189(-10.45,8.55) 190(-10.45,8.25) 191(-10.45,7.95) 192(-10.45,7.65) 193(-10.45,7.35) 194(-10.45,7.05) 195(-10.45,6.75) 196(-10.45,6.45) 197(-10.45,6.15) 198(-10.45,5.85) 199(-10.45,5.55) 200(-10.45,5.25) 201(-10.45,4.95) 202(-10.45,4.65) 203(-10.45,4.35) 204(-10.45,4.05) 205(-10.45,3.75) 206(-10.45,3.45) 207(-10.45,3.15) 208(-10.45,2.85) 209(-10.45,2.55) 210(-10.45,2.25) 211(-10.45,1.95) 212(-10.45,1.65) 213(-10.45,1.35) 214(-10.45,1.05) 215(-10.45,0.75) 216(-10.45,0.45) 217(-10.45,0.15) 218(-10.45,-0.15) 219(-10.45,-0.45) 220(-10.45,-0.75) 221(-10.45,-1.05) 222(-10.45,-1.35) 223(-10.45,-1.65) 224(-10.45,-1.95) 225(-10.45,-2.25) 226(-10.45,-2.55) 227(-10.45,-2.85) 228(-10.45,-3.15) 229(-10.45,-3.45) 230(-10.45,-3.75) 231(-10.45,-4.05) 232(-10.45,-4.35) 233(-10.45,-4.65) 234(-10.45,-4.95) 235(-10.45,-5.25) 236(-10.45,-5.55) 237(-10.45,-5.85) 238(-10.45,-6.15) 239(-10.45,-6.45) 240(-10.45,-6.75) 241(-10.45,-7.05) 242(-10.45,-7.35) 243(-10.45,-7.65) 244(-10.45,-7.95) 245(-10.45,-8.25) 246(-10.45,-8.55) 247(-10.45,-8.85) 248(-10.45,-9.15)
Top Overlay:
  circle w0.254: c-8.5,-8.5 r0.75
  lines w0.203: -9.72,-9.71 9.71,-9.71 9.71,9.71 -9.72,9.71 -9.72,-9.71
Mechanical 16:
  drawing of 252 lines, arcs and shapes, not listed
Mechanical 27:
  lines w0.2: -11.9,-11.9 -11.9,11.9 11.9,11.9 11.9,-11.9 -11.9,-11.9